# Altium footprint library ZLS_Lib.PcbLib: 157 footprints (part 3 of 10)
Each footprint in its own frame and in the unit in brackets; x right, y up, seen from the top. Pads: shape width x height; smd on the part's side, far side on the other; paste and mask are expansions set on the pad; w line width, h text height; cw(c..) or ccw(c..) is an arc to the next point about the centre after c.
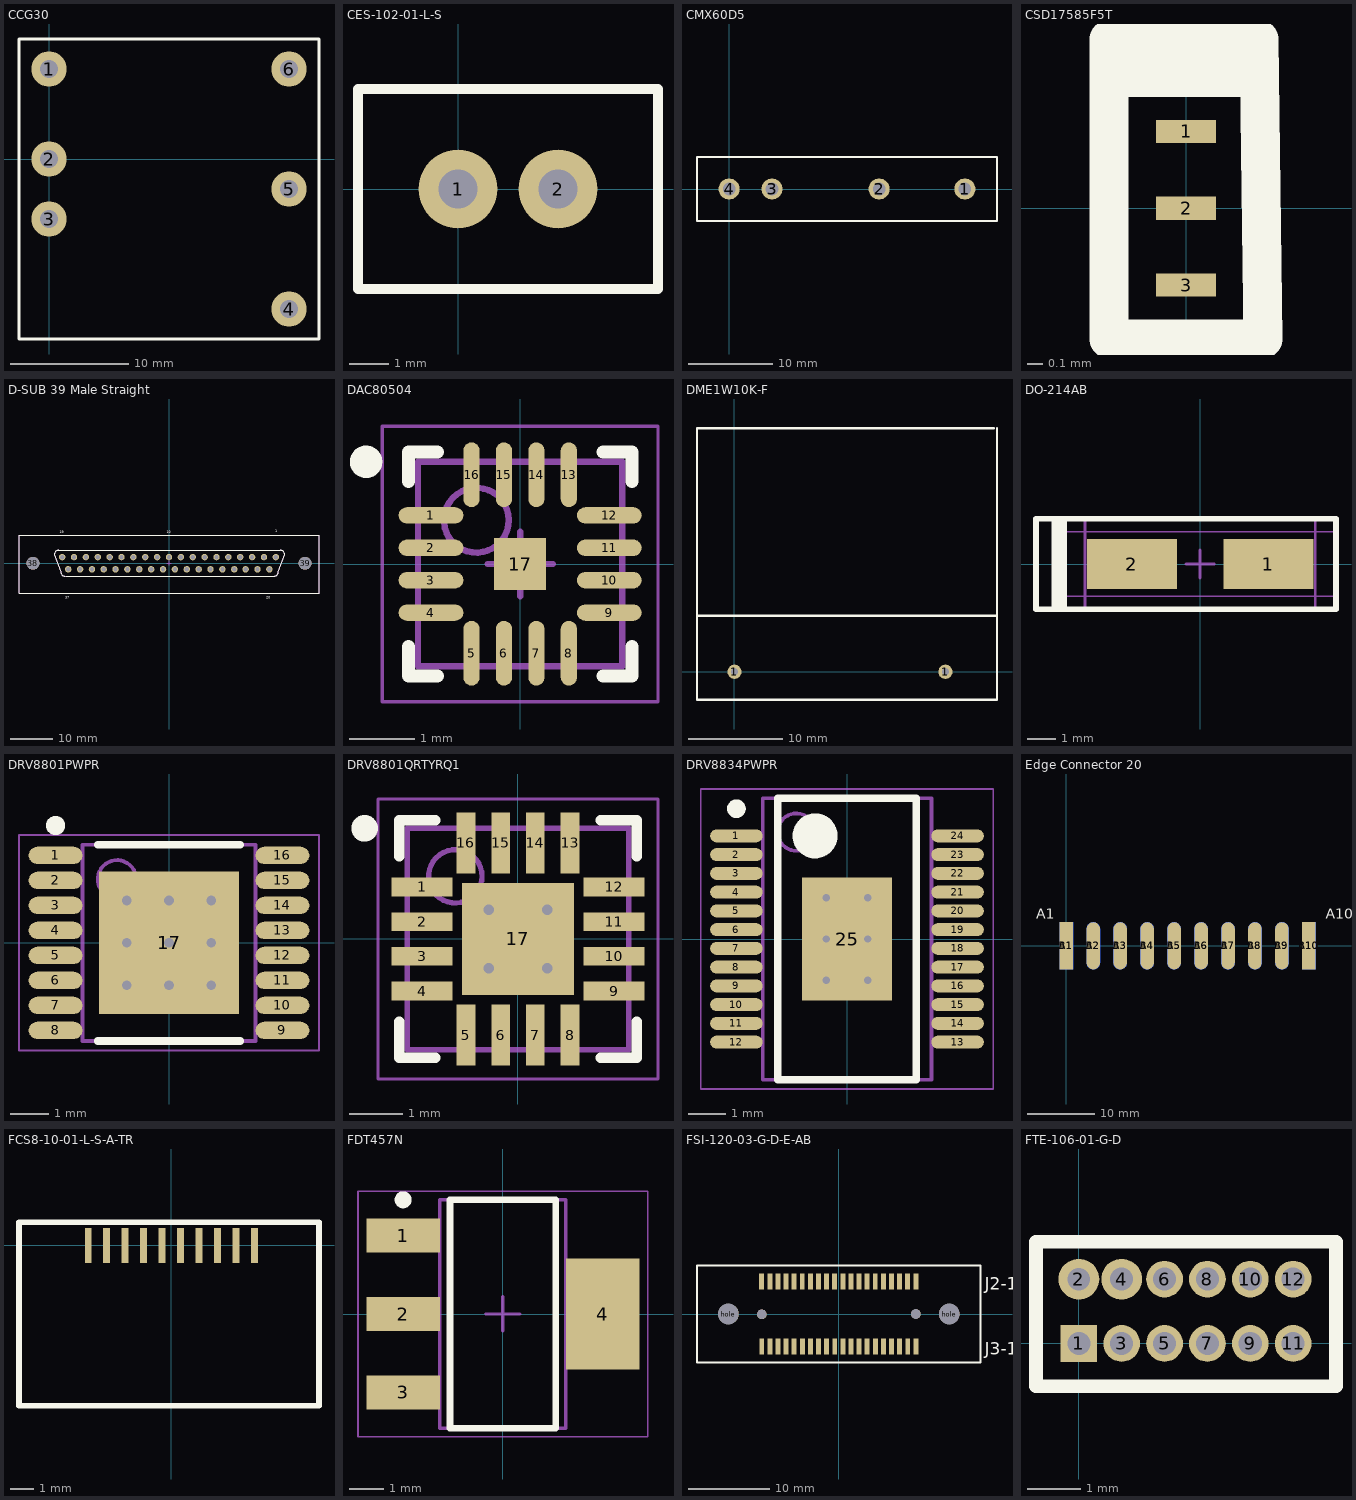
[diagram p2: the footprints below, top view; thin cyan lines are the x and y axes]

## CCG30 [mm] "DC-DC Converter"
height 9.9
pads (6):
  round 3 hole 1.5: 1(0,7.62) 2(0,0) 3(0,-5.08) 4(20.32,-12.7) 5(20.32,-2.54) 6(20.32,7.62)
Top Overlay:
  lines w0.254: -2.54,-15.24 22.86,-15.24 22.86,10.16 13.97,10.16 1.27,10.16 -2.54,10.16 -2.54,5.715 -2.54,-8.255 -2.54,-15.24
3D body: height 9.9, standoff 0, extent -2.667,-15.367 22.987,10.287
3D body: height 9.9, standoff 0, extent -2.539,-15.239 22.859,10.159
3D body: height 9.9, standoff 0, extent -2.539,-15.239 22.859,10.159
3D body: height 9.9, standoff 0, extent -2.667,-15.367 22.987,10.287
3D body: height 9.9, standoff 0, extent -2.667,-15.367 22.987,10.287
3D body: height 9.9, standoff 0, extent -2.667,-15.367 22.987,10.287
3D body: height 9.9, standoff 0, extent -1.602,-14.302 21.922,9.222
3D body: height 9.9, standoff 0, extent -2.667,-15.367 22.987,10.287
3D body: height 9.9, standoff 0, extent -2.539,-15.239 22.859,10.159
3D body: height 9.9, standoff 0, extent -1.602,-14.302 21.922,9.222
3D body: height 9.9, standoff 0, extent -1.602,-14.302 21.922,9.222
3D body: height 9.9, standoff 0, extent -2.667,-15.367 22.987,10.287
3D body: height 9.9, standoff 0, extent -2.539,-15.239 22.859,10.159
3D body: height 9.9, standoff 0, extent -2.667,-15.367 22.987,10.287
3D body: height 9.9, standoff 0, extent -1.602,-14.302 21.922,9.222
3D body: height 9.9, standoff 0, extent -2.667,-15.367 22.987,10.287

## CES-102-01-L-S [mm]
pads (2):
  round 2 hole 1: 1(0,0) 2(2.54,0)
Top Overlay:
  lines w0.254: -2.54,-2.54 -2.54,2.54 5.08,2.54 5.08,-2.54 -2.54,-2.54
3D body "_C_45_01_02_S_4.sldprt": height 4.32, standoff -3.25, extent -1.168,-1.092 3.404,1.194
3D body "_CES_102_01_S_socket_2.sldprt": height 5.08, standoff 0, extent -1.448,-1.499 3.632,1.549

## CMX60D5 [mm] "Solid State Relay"
height 23
pads (4):
  round 2.5 hole 1.5: 1(27.94,0) 2(17.78,0) 3(5.08,0) 4(0,0)
Top Overlay:
  lines w0.254: -3.81,-3.81 -3.81,3.81 31.75,3.81 31.75,-3.81 -3.81,-3.81
3D body: height 25.4, standoff 7.62, extent -3.81,-3.81 31.75,3.81

## CSD17585F5T [mm] "MOSFET N-CH 30V 5.9A PICOSTAR"
height 0.35
pads (3):
  rect 0.39x0.15 smd: 1(0,0.5) 2(0,0) 3(0,-0.5)
Top Overlay:
  lines w0.254: -0.5,0.85 0.475,0.85 0.475,0.8 ; -0.5,-0.85 -0.5,1.1 0.475,1.1 0.5,-0.85 -0.5,-0.85
3D body: height 0.35, standoff 0, extent -0.625,-0.975 0.6,0.975

## D-SUB 39 Male Straight [mm]
pads (39):
  round 1.5 hole 1 unplated: 1(24.905,1.445) 2(22.135,1.445) 3(19.365,1.445) 4(16.595,1.445) 5(13.825,1.445) 6(11.055,1.445) 7(8.285,1.445) 8(5.515,1.445) 9(2.745,1.445) 10(-0.025,1.445) 11(-2.795,1.445) 12(-5.565,1.445) 13(-8.335,1.445) 14(-11.105,1.445) 15(-13.875,1.445) 16(-16.645,1.445) 17(-19.415,1.445) 18(-22.185,1.445) 19(-24.955,1.445) 20(23.395,-1.395) 21(20.625,-1.395) 22(17.855,-1.395) 23(15.205,-1.395) 24(12.435,-1.395) 25(9.665,-1.395) 26(6.895,-1.395) 27(4.125,-1.395) 28(1.355,-1.395) 29(-1.415,-1.395) 30(-4.185,-1.395) 31(-6.955,-1.395) 32(-9.725,-1.395) 33(-12.495,-1.395) 34(-15.265,-1.395) 35(-18.005,-1.395) 36(-20.775,-1.395) 37(-23.545,-1.395)
  round 3 hole 3 unplated: 38(-31.775,0.025) 39(31.725,0.025)
Top Overlay:
  lines w0.254: -26.025,3.025 25.975,3.025 cw(c25.975,2.025) 26.975,2.025 25.475,-1.975 cw(c24.475,-1.975) 24.475,-2.975 -24.025,-2.975 ; -25.775,3.025 ccw(c-25.775,2.025) -26.775,2.025 -25.275,-1.975 ccw(c-24.275,-1.975) -24.275,-2.975 ; -35.025,-6.975 34.975,-6.975 34.975,6.525 -35.025,6.525 -35.025,-6.975
  text "10" at -0.525,7.025 h0.64
  text "19" at -25.525,7.025 h0.64
  text "37" at -24.275,-8.225 h0.64
  text "1" at 24.725,7.275 h0.64
  text "20" at 22.725,-8.225 h0.64
Mechanical 15:
  lines w0.102: -0.525,0.025 0.475,0.025 ; -0.025,-0.475 -0.025,0.525
  lines w0.254: -35.025,-6.975 -35.025,6.525 34.975,6.525 34.975,-6.975 -35.025,-6.975 ; -26.775,2.025 cw(c-25.775,2.025) -25.775,3.025 25.975,3.025 cw(c25.975,2.025) 26.975,2.025 25.475,-1.975 cw(c24.475,-1.975) 24.475,-2.975 -24.275,-2.975 cw(c-24.275,-1.975) -25.275,-1.975 -26.775,2.025

## DAC80504 [mm]
height 0.8
pads (17):
  oval 1x0.25 smd: 1(-1.375,0.75) 2(-1.375,0.25) 3(-1.375,-0.25) 4(-1.375,-0.75) 9(1.375,-0.75) 10(1.375,-0.25) 11(1.375,0.25) 12(1.375,0.75)
  oval 0.25x1 smd: 5(-0.75,-1.375) 6(-0.25,-1.375) 7(0.25,-1.375) 8(0.75,-1.375) 13(0.75,1.375) 14(0.25,1.375) 15(-0.25,1.375) 16(-0.75,1.375)
  rect 0.8x0.8 smd: 17(0,0)
Top Overlay:
  circle w0.25: c-2.375,1.575 r0.125
  lines w0.2: -1.725,-1.275 -1.725,-1.725 -1.275,-1.725 ; -1.725,1.275 -1.725,1.725 -1.275,1.725 ; 1.275,-1.725 1.725,-1.725 1.725,-1.275 ; 1.275,1.725 1.725,1.725 1.725,1.275
Mechanical 13:
  circle w0.1: c-0.675,0.675 r0.5
  lines w0.1: -1.575,-1.575 -1.575,1.575 1.575,1.575 1.575,-1.575 -1.575,-1.575
Mechanical 15:
  lines w0.05: -2.125,-2.125 -2.125,2.125 2.125,2.125 2.125,-2.125 -2.125,-2.125
  lines w0.1: -0.5,0 0.5,0 ; 0,-0.5 0,0.5
3D body "DAC80504.step": height 0.8, standoff 0, extent -1.655,-1.655 1.655,1.655

## DME1W10K-F [mil] "Cap"
height 452.76
pads (2):
  round 60 hole 30: 1(0,0) 1(885.83,0)
Top Overlay:
  lines w10: -157.48,236.22 1102.36,236.22 ; 1090,1023.62 -157.48,1023.62 -157.48,-118.11 1102.36,-118.11 1102.36,1023.62
3D body: height 314.96, standoff 0, extent -162.48,132.8 1107.36,1027.56

## DO-214AB [mil]
height 88.58
pads (2):
  rect 125x70 smd: 1(95,0) 2(-95,0)
Top Overlay:
  rectangle: -206.69,-62.99 -185.04,62.99
  lines w7.87: -228.35,-62.99 -228.35,62.99 188.98,62.99 188.98,-62.99 -228.35,-62.99
Mechanical 13:
  lines w3.94: -160.04,-63.98 -160.04,63.98 160.04,63.98 160.04,-63.98 -160.04,-63.98
Mechanical 15:
  lines w1.97: -186.02,-44.84 -186.02,44.84 186.02,44.84 186.02,-44.84 -186.02,-44.84
  lines w3.94: -19.68,0 19.68,0 ; 0,-19.68 0,19.68
3D body: height 78.74, standoff 0, extent -160.04,-63.98 -138.39,63.72
3D body: height 78.74, standoff 1.71, extent -114.76,-62.83 -91.14,62.59
3D body: height 78.74, standoff 1.77, extent -162.4,-61.02 114.37,64.32
3D body: height 78.74, standoff 0, extent 138.39,-63.98 160.04,63.72
3D body: height 78.74, standoff 0, extent -161.5,-39 161.5,39
3D body: height 78.74, standoff 0, extent -187.01,-45.83 187.01,45.83
3D body: height 78.74, standoff 0, extent -186,-44.82 186,44.82
3D body: height 78.74, standoff 0, extent -19.7,-19.7 19.7,19.7
3D body: height 78.74, standoff 0, extent -162.01,-65.94 162.01,65.94
3D body: height 78.74, standoff 0, extent -160.02,-63.96 160.02,63.96
3D body: height 78.74, standoff 0, extent -187.99,-66.93 192.91,66.93
3D body: height 78.74, standoff 0, extent -184.04,-62.97 188.96,62.97
3D body: height 78.74, standoff 0, extent -187.99,-66.93 192.91,66.93

## DRV8801PWPR [mm] "IC MOTOR DRIVER PAR 16HTSSOP"
height 1.2
pads (17):
  oval 1.4x0.45 smd: 1(-2.95,2.275) 2(-2.95,1.625) 3(-2.95,0.975) 4(-2.95,0.325) 5(-2.95,-0.325) 6(-2.95,-0.975) 7(-2.95,-1.625) 8(-2.95,-2.275) 9(2.95,-2.275) 10(2.95,-1.625) 11(2.95,-0.975) 12(2.95,-0.325) 13(2.95,0.325) 14(2.95,0.975) 15(2.95,1.625) 16(2.95,2.275)
  rect 3.65x3.7 smd: 17(0,0)
via 1.1,-1.1 diameter 0.5 hole 0.254
via 0,-1.1 diameter 0.5 hole 0.254
via -1.1,-1.1 diameter 0.5 hole 0.254
via 1.1,0 diameter 0.5 hole 0.254
via 0,0 diameter 0.5 hole 0.254
via -1.1,0 diameter 0.5 hole 0.254
via 1.1,1.1 diameter 0.5 hole 0.254
via 0,1.1 diameter 0.5 hole 0.254
via -1.1,1.1 diameter 0.5 hole 0.254
Top Overlay:
  circle w0.25: c-2.95,3.05 r0.125
  lines w0.2: -1.85,-2.55 1.85,-2.55 ; -1.85,2.55 1.85,2.55
Mechanical 13:
  circle w0.1: c-1.35,1.65 r0.5
  lines w0.1: -2.25,-2.55 2.25,-2.55 2.25,2.55 -2.25,2.55 -2.25,-2.55
Mechanical 15:
  lines w0.05: -3.9,-2.8 3.9,-2.8 3.9,2.8 -3.9,2.8 -3.9,-2.8
  lines w0.1: -0.5,0 0.5,0 ; 0,-0.5 0,0.5
3D body "DRV8801PWPR .step": height 1.2, standoff 0, extent -3.2,-2.55 3.2,2.55

## DRV8801QRTYRQ1 [mm]
height 0.75
pads (17):
  rect 1.15x0.35 smd: 1(-1.8,0.975) 2(-1.8,0.325) 3(-1.8,-0.325) 4(-1.8,-0.975) 9(1.8,-0.975) 10(1.8,-0.325) 11(1.8,0.325) 12(1.8,0.975)
  rect 0.35x1.15 smd: 5(-0.975,-1.8) 6(-0.325,-1.8) 7(0.325,-1.8) 8(0.975,-1.8) 13(0.975,1.8) 14(0.325,1.8) 15(-0.325,1.8) 16(-0.975,1.8)
  rect 2.1x2.1 smd: 17(0,0)
via -0.55,0.55 diameter 0.5 hole 0.2
via 0.55,0.55 diameter 0.5 hole 0.2
via -0.55,-0.55 diameter 0.5 hole 0.2
via 0.55,-0.55 diameter 0.5 hole 0.2
Top Overlay:
  circle w0.25: c-2.875,2.075 r0.125
  lines w0.2: -2.225,-1.55 -2.225,-2.225 -1.55,-2.225 ; -2.225,1.55 -2.225,2.225 -1.55,2.225 ; 1.55,-2.225 2.225,-2.225 2.225,-1.55 ; 1.55,2.225 2.225,2.225 2.225,1.55
Mechanical 13:
  circle w0.1: c-1.175,1.175 r0.5
  lines w0.1: -2.075,-2.075 -2.075,2.075 2.075,2.075 2.075,-2.075 -2.075,-2.075
Mechanical 15:
  lines w0.05: -2.625,-2.625 -2.625,2.625 2.625,2.625 2.625,-2.625 -2.625,-2.625
  lines w0.1: -0.5,0 0.5,0 ; 0,-0.5 0,0.5
3D body "DRV8801QRTYRQ1.step": height 0.75, standoff 0, extent -2.085,-2.085 2.085,2.085

## DRV8834PWPR [mm]
height 1.2
pads (25):
  oval 1.4x0.35 smd: 1(-2.95,2.75) 2(-2.95,2.25) 3(-2.95,1.75) 4(-2.95,1.25) 5(-2.95,0.75) 6(-2.95,0.25) 7(-2.95,-0.25) 8(-2.95,-0.75) 9(-2.95,-1.25) 10(-2.95,-1.75) 11(-2.95,-2.25) 12(-2.95,-2.75) 13(2.95,-2.75) 14(2.95,-2.25) 15(2.95,-1.75) 16(2.95,-1.25) 17(2.95,-0.75) 18(2.95,-0.25) 19(2.95,0.25) 20(2.95,0.75) 21(2.95,1.25) 22(2.95,1.75) 23(2.95,2.25) 24(2.95,2.75)
  rect 2.4x3.28 smd: 25(0,0)
via 0.55,-1.1 diameter 0.5 hole 0.2
via -0.55,-1.1 diameter 0.5 hole 0.2
via 0.55,0 diameter 0.5 hole 0.2
via -0.55,0 diameter 0.5 hole 0.2
via 0.55,1.1 diameter 0.5 hole 0.2
via -0.55,1.1 diameter 0.5 hole 0.2
Top Overlay:
  circle w0.6: c-0.85,2.75 r0.3
  circle w0.25: c-2.95,3.475 r0.125
  lines w0.2: -1.85,-3.75 1.85,-3.75 1.85,3.75 -1.85,3.75 -1.85,-3.75
Mechanical 13:
  circle w0.1: c-1.35,2.85 r0.5
  lines w0.1: -2.25,-3.75 2.25,-3.75 2.25,3.75 -2.25,3.75 -2.25,-3.75
Mechanical 15:
  lines w0.05: -3.9,-4 3.9,-4 3.9,4 -3.9,4 -3.9,-4
  lines w0.1: -0.5,0 0.5,0 ; 0,-0.5 0,0.5
3D body "DRV8834PWPR.step": height 1.2, standoff 0, extent -3.2,-3.75 3.2,3.75

## Edge Connector 20 [mm]
pads (20):
  rect 2x7 smd: A1(0,0) A10(36,0)
  oval 2x7 smd: A2(4,0) A3(8,0) A4(12,0) A5(16,0) A6(20,0) A7(24,0) A8(28,0) A9(32,0)
  rect 2x7 smd far side: B1(0,0) B10(36,0)
  oval 2x7 smd far side: B2(4,0) B3(8,0) B4(12,0) B5(16,0) B6(20,0) B7(24,0) B8(28,0) B9(32,0)
Top Overlay:
  text "A10" at 38.5,4 h1.52
  text "A1" at -4.5,4 h1.52
Bottom Overlay:
  text "b10" at 38.5,4 h1.52
  text "b1" at -4.5,4 h1.52

## FCS8-10-01-L-S-A-TR [mm] "CONN MULTI-PURP RCPT 10P R/A SMD"
height 5
pads (10):
  rect 0.3x1.524 smd: 1(-3.6,0) 2(-2.8,0) 3(-2,0) 4(-1.2,0) 5(-0.4,0) 6(0.4,0) 7(1.2,0) 8(2,0) 9(2.8,0) 10(3.6,0)
Top Overlay:
  lines w0.254: -6.6,-6.95 -6.6,1 6.4,1 6.4,-6.95 -6.6,-6.95
3D body "_FCS8_10_01_L_S_A_TR_t_2.sldprt": height 1.27, standoff -4.6, extent -7.55,-7 7.55,0
3D body "_FCS8_10_01_L_S_A_TR_s_6.sldprt": height 1.85, standoff -4.95, extent -8.295,-7.46 8.295,0
3D body "_FCS8_10_01_L_S_A_TR_p_4.sldprt": height -0.06, standoff -2.2, extent -3.765,-6.442 3.765,0

## FDT457N [mm] "SOT223, 4-Leads, Body 6.50x7.00mm (avg), Pitch 2.30mm, IPC Medium Density"
height 1.8
pads (4):
  rect 2.15x1 smd: 1(-2.925,2.3) 2(-2.925,0) 3(-2.925,-2.3)
  rect 2.15x3.25 smd: 4(2.925,0)
Top Overlay:
  circle w0.25: c-2.925,3.35 r0.125
  lines w0.2: -1.55,-3.35 -1.55,3.35 1.55,3.35 1.55,-3.35 -1.55,-3.35
Mechanical 13:
  lines w0.1: -1.85,-3.35 -1.85,3.35 1.85,3.35 1.85,-3.35 -1.85,-3.35
Mechanical 15:
  lines w0.05: -4.25,-3.6 -4.25,3.6 4.25,3.6 4.25,-3.6 -4.25,-3.6
  lines w0.1: -0.5,0 0.5,0 ; 0,-0.5 0,0.5
3D body "FDT457N.step": height 1.8, standoff 0, extent -3.5,-3.35 3.5,3.35

## FSI-120-03-G-D-E-AB [mil]
height 50
pads (44):
  round 100 hole 100: hole(-536.2,0) hole(536.2,0)
  round 47 hole 47: hole(-374.3,-1.6) hole(374.3,0)
  rect 24x78.74 smd: J2-1(373.91,157.36) J2-2(334.51,157.36) J2-3(295.11,157.36) J2-4(255.71,157.36) J2-5(216.31,157.36) J2-6(176.91,157.36) J2-7(137.51,157.36) J2-8(98.11,157.36) J2-9(58.71,157.36) J2-10(19.31,157.36) J2-11(-20.09,157.36) J2-12(-59.49,157.36) J2-13(-98.89,157.36) J2-14(-138.29,157.36) J2-15(-177.69,157.36) J2-16(-217.09,157.36) J2-17(-256.49,157.36) J2-18(-295.89,157.36) J2-19(-335.29,157.36) J2-20(-374.69,157.36) J3-1(374.3,-157.36) J3-2(334.9,-157.36) J3-3(295.5,-157.36) J3-4(256.1,-157.36) J3-5(216.7,-157.36) J3-6(177.3,-157.36) J3-7(137.9,-157.36) J3-8(98.5,-157.36) J3-9(59.1,-157.36) J3-10(19.7,-157.36) J3-11(-19.7,-157.36) J3-12(-59.1,-157.36) J3-13(-98.5,-157.36) J3-14(-137.9,-157.36) J3-15(-177.3,-157.36) J3-16(-216.7,-157.36) J3-17(-256.1,-157.36) J3-18(-295.5,-157.36) J3-19(-334.9,-157.36) J3-20(-374.3,-157.36)
Top Overlay:
  lines w10: -688.98,-236.4 -688.98,236.4 688.98,236.4 688.98,-236.4 -688.98,-236.4
  text "J2-1" at 708.38,117.99 h60
  text "J3-1" at 708.38,-196.97 h60
3D body "_FSI_120_03_G_D_E_AB_terminal_2.sldprt": height 112.11, standoff -61, extent -632.87,-156.75 709.65,188.13
3D body "_FSI_120_03_D_E_pin_4.sldprt": height 162.47, standoff 10, extent -381.89,-0.5 380.31,185.04
3D body "_FSI_120_03_D_E_pin_4.sldprt": height 152.47, standoff 0, extent -382.87,-179.38 379.33,6.15

## FTE-106-01-G-D [mil]
height 161
pads (12):
  rect 27x27 hole 16.93: 1(0,0)
  round 30 hole 16.73 paste+2: 2(0,47.24)
  round 27 hole 16.93: 3(31.5,0) 5(63,0) 6(63,47.24) 7(94.5,0) 8(94.5,47.24) 9(125.98,0) 10(126,47.24) 11(157.5,0) 12(157.5,47.24)
  round 30 hole 16.93: 4(31.5,47.24)
Top Overlay:
  lines w10: -31.5,-31.5 -31.5,74.8 189,74.8 189,-31.5 -31.5,-31.5